# Altium footprint library lib_datalogger.PcbLib: 866 footprints (part 45 of 55)
Each footprint in its own frame and in the unit in brackets; x right, y up, seen from the top. Pads: shape width x height; smd on the part's side, far side on the other; paste and mask are expansions set on the pad; w line width, h text height; cw(c..) or ccw(c..) is an arc to the next point about the centre after c.
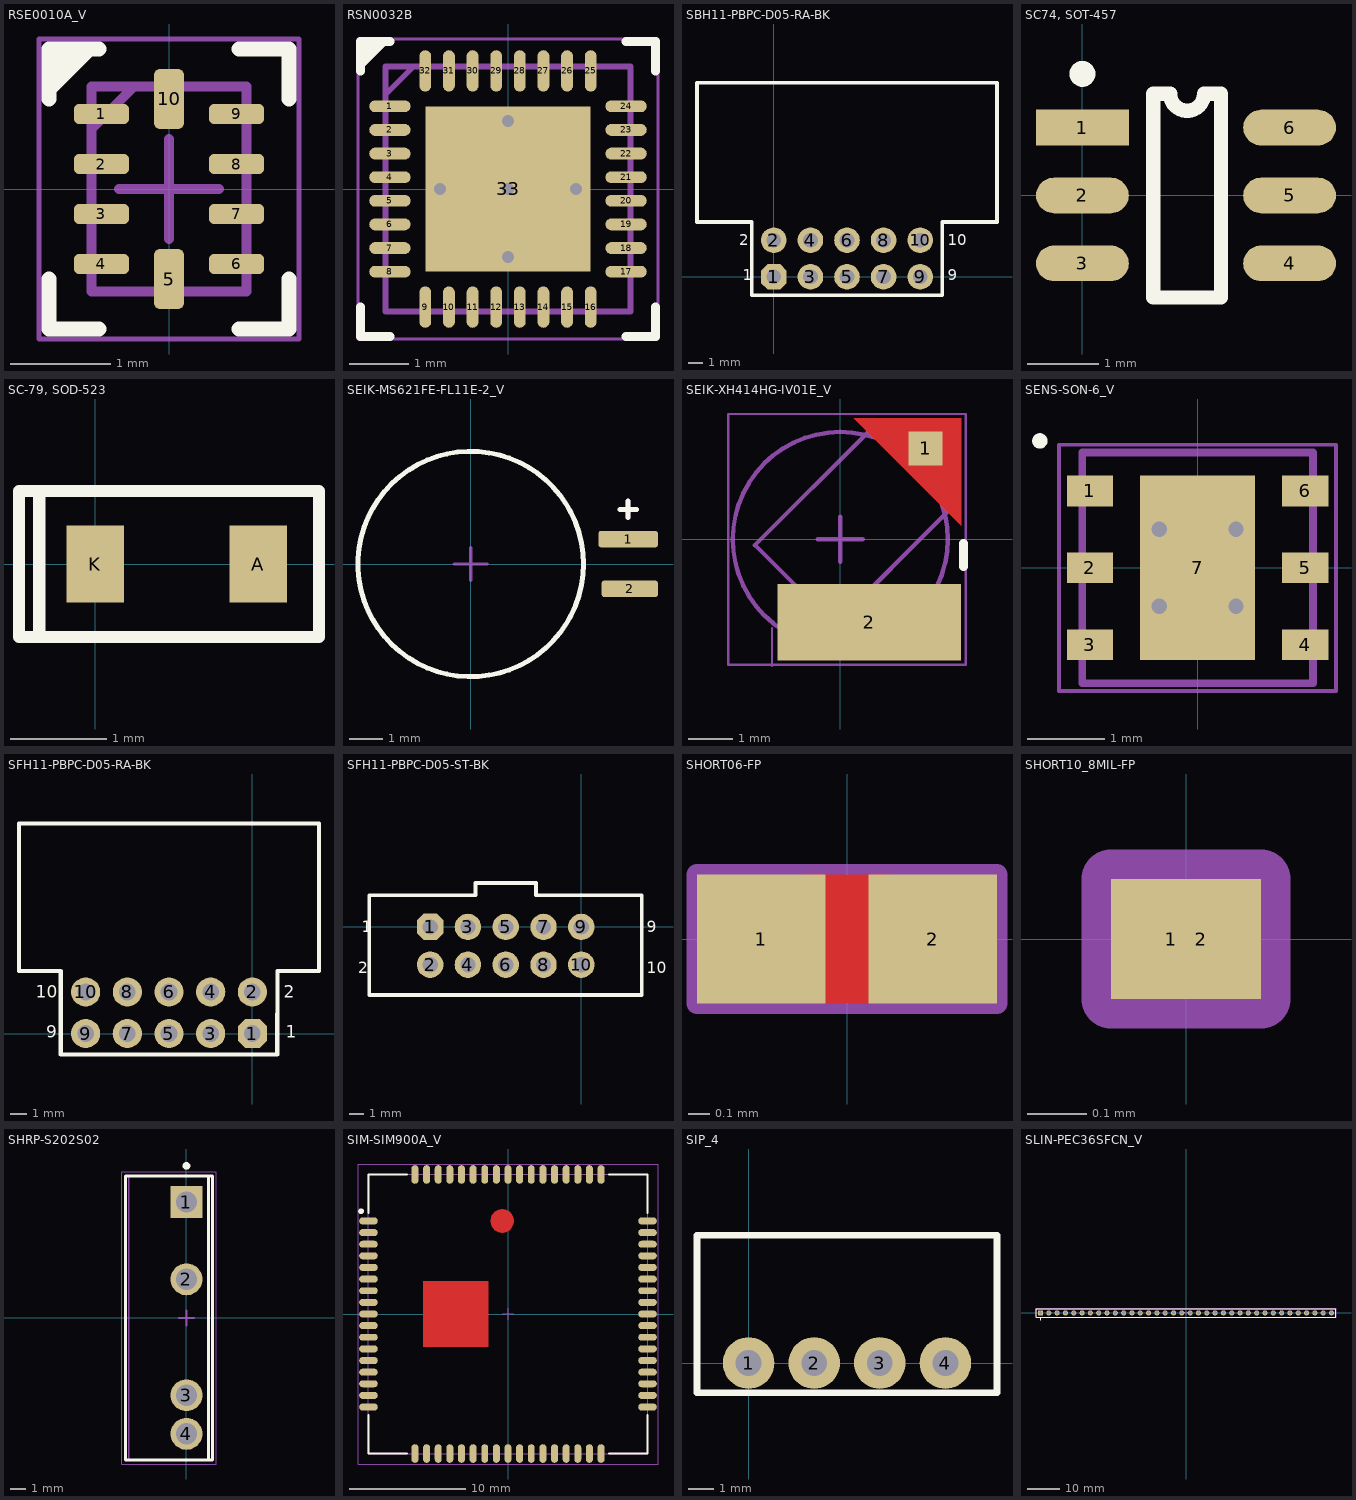
[diagram p44: the footprints below, top view; thin cyan lines are the x and y axes]

## RSE0010A_V [mm] "QFN, 10-Leads, Body 1.5x2mm, Pitch 0.5mm, TI Recommended"
height 0.6
pads (10):
  rrect50% 0.55x0.2 smd: 1(-0.675,0.75) 2(-0.675,0.25) 3(-0.675,-0.25) 4(-0.675,-0.75) 6(0.675,-0.75) 7(0.675,-0.25) 8(0.675,0.25) 9(0.675,0.75)
  rrect40% 0.3x0.6 smd: 5(0,-0.9) 10(0,0.9)
Top Overlay:
  region: -1.2,1.4 -1.2,1 -0.8,1.4
  lines w0.15: -1.2,-0.9 -1.2,-1.4 -0.7,-1.4 ; -1.2,0.9 -1.2,1.4 -0.7,1.4 ; -1.2,1 -0.8,1.4 ; 0.7,-1.4 1.2,-1.4 1.2,-0.9 ; 0.7,1.4 1.2,1.4 1.2,0.9
Mechanical 13:
  lines w0.1: -0.775,0.6 -0.35,1.025 ; -0.775,-1.025 -0.775,1.025 0.775,1.025 0.775,-1.025 -0.775,-1.025
Mechanical 15:
  lines w0.05: -1.3,-1.5 -1.3,1.5 1.3,1.5 1.3,-1.5 -1.3,-1.5
  lines w0.1: -0.5,0 0.5,0 ; 0,-0.5 0,0.5
Top Designator:
  text ".Designator" at -1.27,-0.127 h0.6
3D body "User Library-QFN-10 2x1_5mm.step": height 0.6, standoff 0, extent -0.75,-1 0.75,1

## RSN0032B [mm] "Texas Instruments"
height 0.8
pads (33):
  oval 0.7x0.2 smd: 1(-2,1.4) 2(-2,1) 3(-2,0.6) 4(-2,0.2) 5(-2,-0.2) 6(-2,-0.6) 7(-2,-1) 8(-2,-1.4) 17(2,-1.4) 18(2,-1) 19(2,-0.6) 20(2,-0.2) 21(2,0.2) 22(2,0.6) 23(2,1) 24(2,1.4)
  oval 0.2x0.7 smd: 9(-1.4,-2) 10(-1,-2) 11(-0.6,-2) 12(-0.2,-2) 13(0.2,-2) 14(0.6,-2) 15(1,-2) 16(1.4,-2) 25(1.4,2) 26(1,2) 27(0.6,2) 28(0.2,2) 29(-0.2,2) 30(-0.6,2) 31(-1,2) 32(-1.4,2)
  rect 2.8x2.8 smd paste-1.4: 33(0,0)
via 0,1.15 diameter 0.4 hole 0.2
via -1.15,0 diameter 0.4 hole 0.2
via 0,0 diameter 0.4 hole 0.2
via 1.15,0 diameter 0.4 hole 0.2
via 0,-1.15 diameter 0.4 hole 0.2
Top Overlay:
  region: -2.5,2.5 -2.5,2.1 -2.1,2.5
  lines w0.15: -2.5,-2 -2.5,-2.5 -2,-2.5 ; -2.5,2 -2.5,2.5 -2,2.5 ; -2.5,2.1 -2.1,2.5 ; 2,-2.5 2.5,-2.5 2.5,-2 ; 2,2.5 2.5,2.5 2.5,2
Top Paste:
  rectangle: 0.1,0.1 1.37,1.37
  region: -0.1,1.37 -1.37,1.37 -1.37,0.1 -0.1,0.1
  region: -0.1,-0.1 -1.37,-0.1 -1.37,-1.37 -0.1,-1.37
  rectangle: 0.1,-1.37 1.37,-0.1
Mechanical 13:
  lines w0.1: -2.075,1.6 -1.6,2.075 ; -2.075,-2.075 2.075,-2.075 2.075,2.075 -2.075,2.075 -2.075,-2.075
Mechanical 15:
  lines w0.05: -2.54,-2.54 -2.54,2.54 2.54,2.54 2.54,-2.54 -2.54,-2.54
  lines w0.1: -0.5,0 0.5,0 ; 0,-0.5 0,0.5
Top Designator:
  text ".Designator" at -1.27,-0.127 h0.6
3D body "tps51220_RSN32_2P8X2P8.stp": height 1, standoff 0, extent -2.126,-2.126 2.126,2.126

## SBH11-PBPC-D05-RA-BK [mil]
pads (10):
  oct 70x70 hole 40.16: 1(0,0)
  round 70 / inner round 60 / far side round 60 hole 40.16: 2(0,100) 3(100,0) 4(100,100) 5(200,0) 6(200,100) 7(300,0) 8(300,100) 9(400,0) 10(400,100)
Top Overlay:
  lines w10: -210,150 -210,530 610,530 610,150 460,150 460,-50 -60,-50 -60,150 -210,150
  text "10" at 475.01,86 h30
  text "9" at 475.01,-10 h30
  text "2" at -95,86 h30
  text "1" at -85,-10 h30
3D body "SBH11-_ _ _C-D05-RA-_ _.STEP": height 358.27, standoff -125.98, extent -198.14,-14.43 597.14,521

## SC74, SOT-457 [mm]
pads (6):
  rect 1.3x0.5 smd: 1(0,0.95)
  oval 1.3x0.5 smd: 2(0,0) 3(0,-0.95) 4(2.9,-0.95) 5(2.9,0) 6(2.9,0.95)
Top Overlay:
  circle w0.203: c0,1.702 r0.079
  lines w0.2: 0.991,-1.428 1.941,-1.428 1.941,1.422 1.703,1.422 cw(c1.466,1.422) 1.228,1.422 0.991,1.422 0.991,-1.428
3D body "sc74.step": height 0.94, standoff -0.09, extent 0.065,-1.5 2.835,1.5

## SC-79, SOD-523 [mm]
pads (2):
  rect 0.6x0.8 smd: A(1.7,0) K(0,0)
Top Overlay:
  lines w0.127: -0.584,-0.762 2.337,-0.762 2.337,0.762 -0.584,0.762 ; -0.584,-0.762 -0.584,0.762 ; -0.584,-0.762 -0.796,-0.762 -0.796,0.762 -0.584,0.762
3D body "SOD523.step": height 0.7, standoff 0, extent 0.05,-0.399 1.65,0.399

## SEIK-MS621FE-FL11E-2_V [mm] "SMD, 2-Leads, Diameter 6.8mm"
height 2.7
pads (2):
  rrect35% 1.8x0.5 smd: 1(4.75,0.75)
  rrect35% 1.7x0.5 smd: 2(4.8,-0.75)
Top Overlay:
  circle w0.15: c0,0 r3.4
  lines w0.15: 4.5,1.65 5,1.65 ; 4.75,1.4 4.75,1.9
Mechanical 13:
  lines w0.15: 4.5,1.65 5,1.65 ; 4.75,1.4 4.75,1.9
Mechanical 15:
  lines w0.1: -0.5,0 0.5,0 ; 0,-0.5 0,0.5
Top 3D Body:
  circle w0.1: c0,0 r3.4
Top Designator:
  text ".Designator" at -1.27,-0.127 h0.6
3D body: height 0.15, standoff 0, extent 3.7,-1 4.35,-0.5
3D body: height 0.15, standoff 0, extent 3.7,0.5 4.35,1
3D body: height 2.7, standoff 2.6, extent -1.397,-1 3.7,1
3D body: height 2.7, standoff 0.15, extent 3.7,-1 3.85,1
3D body: height 2.6, standoff 0, extent -3.399,-3.399 3.399,3.399

## SEIK-XH414HG-IV01E_V [mm] "SMD, 2-Leads, Diameter 4.8mm"
height 1.85
pads (2):
  rect 0.762x0.762 smd: 1(1.905,2.032)
  rect 4.1x1.7 smd: 2(0.65,-1.85)
Top Layer:
  region: 0.3,2.7 2.7,2.7 2.7,0.3
Top Overlay:
  lines w0.2: 2.75,-0.603 2.75,-0.097
Mechanical 13:
  circle w0.1: c0,0 r2.4
  lines w0.1: -1.905,-0.127 -0.127,-1.906 2.4,0.621 2.4,2.399 ; -1.905,-0.127 -1.905,-0.127 ; -1.905,-0.127 0.621,2.399 2.4,2.399 ; 2.4,2.399 2.4,2.399
Mechanical 15:
  lines w0.05: -1.526,-2.825 -1.526,-1.98 ; -2.5,-2.8 -2.5,2.8 2.8,2.8 2.8,-2.8 -2.5,-2.8
  lines w0.1: -0.5,0 0.5,0 ; 0,-0.5 0,0.5
3D body: height 1.85, standoff 0, extent -1.905,-1.906 2.4,2.399
3D body: height 1.67, standoff 0, extent -2.4,-2.399 2.4,2.399

## SENS-SON-6_V [mm] "SON, 6-Leads, Body 3x3mm, Pitch 1mm, Thermal Pad 2.4x1.5mm"
height 1.1
pads (7):
  rect 0.6x0.4 smd: 1(-1.4,1) 2(-1.4,0) 3(-1.4,-1) 4(1.4,-1) 5(1.4,0) 6(1.4,1)
  rect 1.5x2.4 smd: 7(0,0)
via 0.5,-0.5 diameter 0.5 hole 0.2
via -0.5,-0.5 diameter 0.5 hole 0.2
via 0.5,0.5 diameter 0.5 hole 0.2
via -0.5,0.5 diameter 0.5 hole 0.2
Top Overlay:
  circle w0.1: c-2.05,1.65 r0.05
Mechanical 13:
  lines w0.1: -1.5,-1.5 1.5,-1.5 1.5,1.5 -1.5,1.5 -1.5,-1.5
Mechanical 15:
  lines w0.05: -1.8,-1.6 1.8,-1.6 1.8,1.6 -1.8,1.6 -1.8,-1.6
  lines w0.1: -0.5,0 0.5,0 ; 0,-0.5 0,0.5
3D body: height 1.1, standoff 0, extent -1.499,-1.499 1.499,1.499
3D body: height 0.5, standoff 0, extent -0.899,-0.899 0.899,-0.501
3D body: height 0.9, standoff 0, extent -1.199,-1.199 1.199,-0.201

## SFH11-PBPC-D05-RA-BK [mil]
pads (10):
  oct 70x70 hole 40.16: 1(0,0)
  round 70 / inner round 60 / far side round 60 hole 40.16: 2(0,100) 3(-100,0) 4(-100,100) 5(-200,0) 6(-200,100) 7(-300,0) 8(-300,100) 9(-400,0) 10(-400,100)
Top Overlay:
  lines w10: -560,150 -560,504 160,504 160,150 60,150 60,-50 -460,-50 -460,150 -560,150
  text "10" at -519.99,86 h30
  text "9" at -495,-10 h30
  text "2" at 75.01,86 h30
  text "1" at 80.01,-10 h30
3D body "SFH11-_ _ _C-D05-RA-_ _.STEP": height 277.56, standoff -104.33, extent -550,-11.94 150,493.57

## SFH11-PBPC-D05-ST-BK [mil]
pads (10):
  oct 70x70 hole 40.16: 1(-400,0)
  round 70 / inner round 60 / far side round 60 hole 40.16: 2(-400,-100) 3(-300,0) 4(-300,-100) 5(-200,0) 6(-200,-100) 7(-100,0) 8(-100,-100) 9(0,0) 10(0,-100)
Top Overlay:
  lines w10: -561,-180 160,-180 160,84 -120,84 -120,116 -280,116 -280,84 -561,84 -561,-180
  text "1" at -581,-13.99 h30
  text "2" at -590.99,-121.99 h30
  text "9" at 173.01,-13.99 h30
  text "10" at 173.01,-121.99 h30
3D body "SFH11-_ _ _C-D05-ST-_ _.STEP": height 336.61, standoff -124.02, extent -550,-166.8 150,108.8

## SHORT06-FP [mm]
pads (2):
  rect 0.6x0.6 smd paste-0.4 mask+0.102: 1(-0.4,0) 2(0.4,0)
Top Layer:
  region: -0.2,0.3
  region: -0.2,0.3 -0.2,-0.3 0.2,-0.3 0.2,0.3
Mechanical 13:
  lines w0.1: -0.7,-0.3 0.7,-0.3 0.7,0.3 -0.7,0.3 -0.7,-0.3
Top Designator:
  text ".Designator" at -1.27,0.381 h0.6

## SHORT10_8MIL-FP [mil]
pads (2):
  rect 8x8 smd paste-39.37: 1(-1,0) 2(1,0)
Mechanical 13:
  lines w3.94: -5,-4 -5,4 5,4 5,-4 -5,-4
Top Designator:
  text ".Designator" at -50,0 h23.62

## SHRP-S202S02 [mm] "THD, 4-Leads, Body 5.7x18.7mm, Pitch 2.54mm"
height 29.17
pads (4):
  rect 2.1x2.1 hole 1.4: 1(0,7.62)
  round 2.1 hole 1.4: 2(0,2.54) 3(0,-5.08) 4(0,-7.62)
Top Overlay:
  circle w0.25: c0,10 r0.125
  lines w0.2: 1.45,-9.35 1.45,9.35 ; -4,-9.35 1.7,-9.35 1.7,9.35 -4,9.35 -4,-9.35
Mechanical 13:
  lines w0.1: -3.8,-9.35 -3.8,9.35 ; -4,-9.35 -4,9.35 1.7,9.35 1.7,-9.35 -4,-9.35
Mechanical 15:
  lines w0.05: -4.25,-9.6 -4.25,9.6 1.95,9.6 1.95,-9.6 -4.25,-9.6
  lines w0.1: -0.5,0 0.5,0 ; 0,-0.5 0,0.5
3D body: height 4.2, standoff 0, extent -0.3,6.995 0.3,8.245
3D body: height 0, standoff -1.6, extent -0.3,7.07 0.3,8.17
3D body: height 4.2, standoff 0, extent -0.3,1.915 0.3,3.165
3D body: height 0, standoff -1.6, extent -0.3,1.99 0.3,3.09
3D body: height 4.2, standoff 0, extent -0.3,-5.705 0.3,-4.455
3D body: height 0, standoff -1.6, extent -0.3,-5.63 0.3,-4.53
3D body: height 4.2, standoff 0, extent -0.3,-8.245 0.3,-6.995
3D body: height 0, standoff -1.6, extent -0.3,-8.17 0.3,-7.07
3D body: height 24.17, standoff 4.2, extent -4,-9.35 1.7,9.35
3D body: height 24.37, standoff 24.17, extent -3.8,-8.2 1.7,8.2
3D body: height 24.41, standoff 24.37, extent -3.8,0.312 1.7,8.2
3D body: height 24.41, standoff 24.37, extent -3.8,-8.2 1.7,-0.312
3D body: height 27.57, standoff 27.54, extent -3.8,0.312 1.7,8.2
3D body: height 27.57, standoff 27.54, extent -3.8,-8.2 1.7,-0.312
3D body: height 24.5, standoff 24.4, extent -3.8,0.612 1.7,8.2
3D body: height 24.5, standoff 24.4, extent -3.8,-8.2 1.7,-0.612
3D body: height 27.54, standoff 27.45, extent -3.8,0.612 1.7,8.2
3D body: height 27.54, standoff 27.45, extent -3.8,-8.2 1.7,-0.612
3D body: height 24.64, standoff 24.49, extent -3.8,0.889 1.7,8.2
3D body: height 24.64, standoff 24.49, extent -3.8,-8.2 1.7,-0.889
3D body: height 27.45, standoff 27.3, extent -3.8,0.889 1.7,8.2
3D body: height 27.45, standoff 27.3, extent -3.8,-8.2 1.7,-0.889
3D body: height 24.84, standoff 24.64, extent -3.8,1.131 1.7,8.2
3D body: height 24.84, standoff 24.64, extent -3.8,-8.2 1.7,-1.131
3D body: height 27.31, standoff 27.1, extent -3.8,1.131 1.7,8.2
3D body: height 27.31, standoff 27.1, extent -3.8,-8.2 1.7,-1.131
3D body: height 25.09, standoff 24.84, extent -3.8,1.33 1.7,8.2
3D body: height 25.09, standoff 24.84, extent -3.8,-8.2 1.7,-1.33
3D body: height 27.11, standoff 26.86, extent -3.8,1.33 1.7,8.2
3D body: height 27.11, standoff 26.86, extent -3.8,-8.2 1.7,-1.33
3D body: height 25.36, standoff 25.08, extent -3.8,1.478 1.7,8.2
3D body: height 25.36, standoff 25.08, extent -3.8,-8.2 1.7,-1.478
3D body: height 26.86, standoff 26.58, extent -3.8,1.478 1.7,8.2
3D body: height 26.86, standoff 26.58, extent -3.8,-8.2 1.7,-1.478
3D body: height 25.66, standoff 25.36, extent -3.8,1.569 1.7,8.2
3D body: height 25.66, standoff 25.36, extent -3.8,-8.2 1.7,-1.569
3D body: height 26.59, standoff 26.28, extent -3.8,1.569 1.7,8.2
3D body: height 26.59, standoff 26.28, extent -3.8,-8.2 1.7,-1.569
3D body: height 25.97, standoff 25.66, extent -3.8,1.6 1.7,8.2
3D body: height 25.97, standoff 25.66, extent -3.8,-8.2 1.7,-1.6
3D body: height 26.29, standoff 25.97, extent -3.8,1.6 1.7,8.2
3D body: height 26.29, standoff 25.97, extent -3.8,-8.2 1.7,-1.6
3D body: height 29.17, standoff 27.57, extent -3.8,-8.2 1.7,8.2

## SIM-SIM900A_V [mm] "LCC, 68-Leads, Body 24x24mm, Pitch 1mm"
height 3.15
pads (68):
  oval 1.6x0.6 smd: 1(-12,8) 2(-12,7) 3(-12,6) 4(-12,5) 5(-12,4) 6(-12,3) 7(-12,2) 8(-12,1) 9(-12,0) 10(-12,-1) 11(-12,-2) 12(-12,-3) 13(-12,-4) 14(-12,-5) 15(-12,-6) 16(-12,-7) 17(-12,-8) 35(12,-8) 36(12,-7) 37(12,-6) 38(12,-5) 39(12,-4) 40(12,-3) 41(12,-2) 42(12,-1) 43(12,0) 44(12,1) 45(12,2) 46(12,3) 47(12,4) 48(12,5) 49(12,6) 50(12,7) 51(12,8)
  oval 0.6x1.6 smd: 18(-8,-12) 19(-7,-12) 20(-6,-12) 21(-5,-12) 22(-4,-12) 23(-3,-12) 24(-2,-12) 25(-1,-12) 26(0,-12) 27(1,-12) 28(2,-12) 29(3,-12) 30(4,-12) 31(5,-12) 32(6,-12) 33(7,-12) 34(8,-12) 52(8,12) 53(7,12) 54(6,12) 55(5,12) 56(4,12) 57(3,12) 58(2,12) 59(1,12) 60(0,12) 61(-1,12) 62(-2,12) 63(-3,12) 64(-4,12) 65(-5,12) 66(-6,12) 67(-7,12) 68(-8,12)
Top Layer:
  pour cut-out: -0.5,7 -0.598,7 -0.792,7.038 -0.974,7.114 -1.137,7.223 -1.277,7.363 -1.386,7.526 -1.462,7.708 -1.5,7.902 -1.5,8 -1.5,8.098 -1.462,8.292 -1.386,8.474 -1.277,8.637 -1.137,8.777 -0.974,8.886 -0.792,8.962 -0.598,9 -0.5,9 -0.402,9 -0.208,8.962 -0.026,8.886 0.137,8.777 0.277,8.637 0.386,8.474 0.462,8.292 0.5,8.098 0.5,8 0.5,7.902 0.462,7.708 0.386,7.526 0.277,7.363 0.137,7.223 -0.026,7.114 -0.208,7.038 -0.402,7
  pour cut-out: -7.3,-2.8 -1.7,-2.8 -1.7,2.8 -7.3,2.8
Top Overlay:
  circle w0.25: c-12.638,8.839 r0.125
  lines w0.2: -12,-8.7 -12,-12 -8.7,-12 ; -12,8.7 -12,12 -8.7,12 ; 8.7,-12 12,-12 12,-8.7 ; 8.7,12 12,12 12,8.7
Mechanical 13:
  lines w0.1: -12,-12 -12,12 12,12 12,-12 -12,-12
Mechanical 15:
  lines w0.05: -12.9,-12.9 12.9,-12.9 12.9,12.9 -12.9,12.9 -12.9,-12.9
  lines w0.1: -0.5,0 0.5,0 ; 0,-0.5 0,0.5
3D body: height 3.15, standoff 1, extent -11.22,-11.295 11.22,11.295
3D body: height 1, standoff 0, extent -12,-12 12,12

## SIP_4 [mm]
pads (4):
  round 2 hole 1: 1(0,0) 2(2.54,0) 3(5.08,0) 4(7.62,0)
Top Overlay:
  lines w0.254: -2,-1.15 9.62,-1.15 9.62,4.95 -2,4.95 -2,-1.15
3D body "mps_dcdc_nke_sc_a.step": height 7.58, standoff -4, extent -1.94,-1.11 9.56,4.91

## SLIN-PEC36SFCN_V [mm] "THD, 36-Leads, Body 91.44x2.54mm, Pitch 2.54mm"
height 10.62
pads (36):
  rect 1.55x1.55 hole 1.016: 1(-44.45,0)
  round 1.55 hole 1.016: 2(-41.91,0) 3(-39.37,0) 4(-36.83,0) 5(-34.29,0) 6(-31.75,0) 7(-29.21,0) 8(-26.67,0) 9(-24.13,0) 10(-21.59,0) 11(-19.05,0) 12(-16.51,0) 13(-13.97,0) 14(-11.43,0) 15(-8.89,0) 16(-6.35,0) 17(-3.81,0) 18(-1.27,0) 19(1.27,0) 20(3.81,0) 21(6.35,0) 22(8.89,0) 23(11.43,0) 24(13.97,0) 25(16.51,0) 26(19.05,0) 27(21.59,0) 28(24.13,0) 29(26.67,0) 30(29.21,0) 31(31.75,0) 32(34.29,0) 33(36.83,0) 34(39.37,0) 35(41.91,0) 36(44.45,0)
Top Overlay:
  circle w0.25: c-44.45,-1.92 r0.125
  lines w0.2: -45.72,-1.27 -45.72,1.27 45.72,1.27 45.72,-1.27 -45.72,-1.27
Mechanical 13:
  lines w0.1: -45.72,-1.27 -45.72,1.27 45.72,1.27 45.72,-1.27 -45.72,-1.27
Mechanical 15:
  lines w0.05: -45.82,-1.37 45.82,-1.37 45.82,1.37 -45.82,1.37 -45.82,-1.37
  lines w0.1: -0.5,0 0.5,0 ; 0,-0.5 0,0.5
3D body "_ _C36SFCN.STEP": height 10.62, standoff -8.13, extent -45.72,-1.27 45.72,1.27